# Altium footprint library Chestin_PcbLib.PcbLib: 203 footprints (part 10 of 13)
Each footprint in its own frame and in the unit in brackets; x right, y up, seen from the top. Pads: shape width x height; smd on the part's side, far side on the other; paste and mask are expansions set on the pad; w line width, h text height; cw(c..) or ccw(c..) is an arc to the next point about the centre after c.
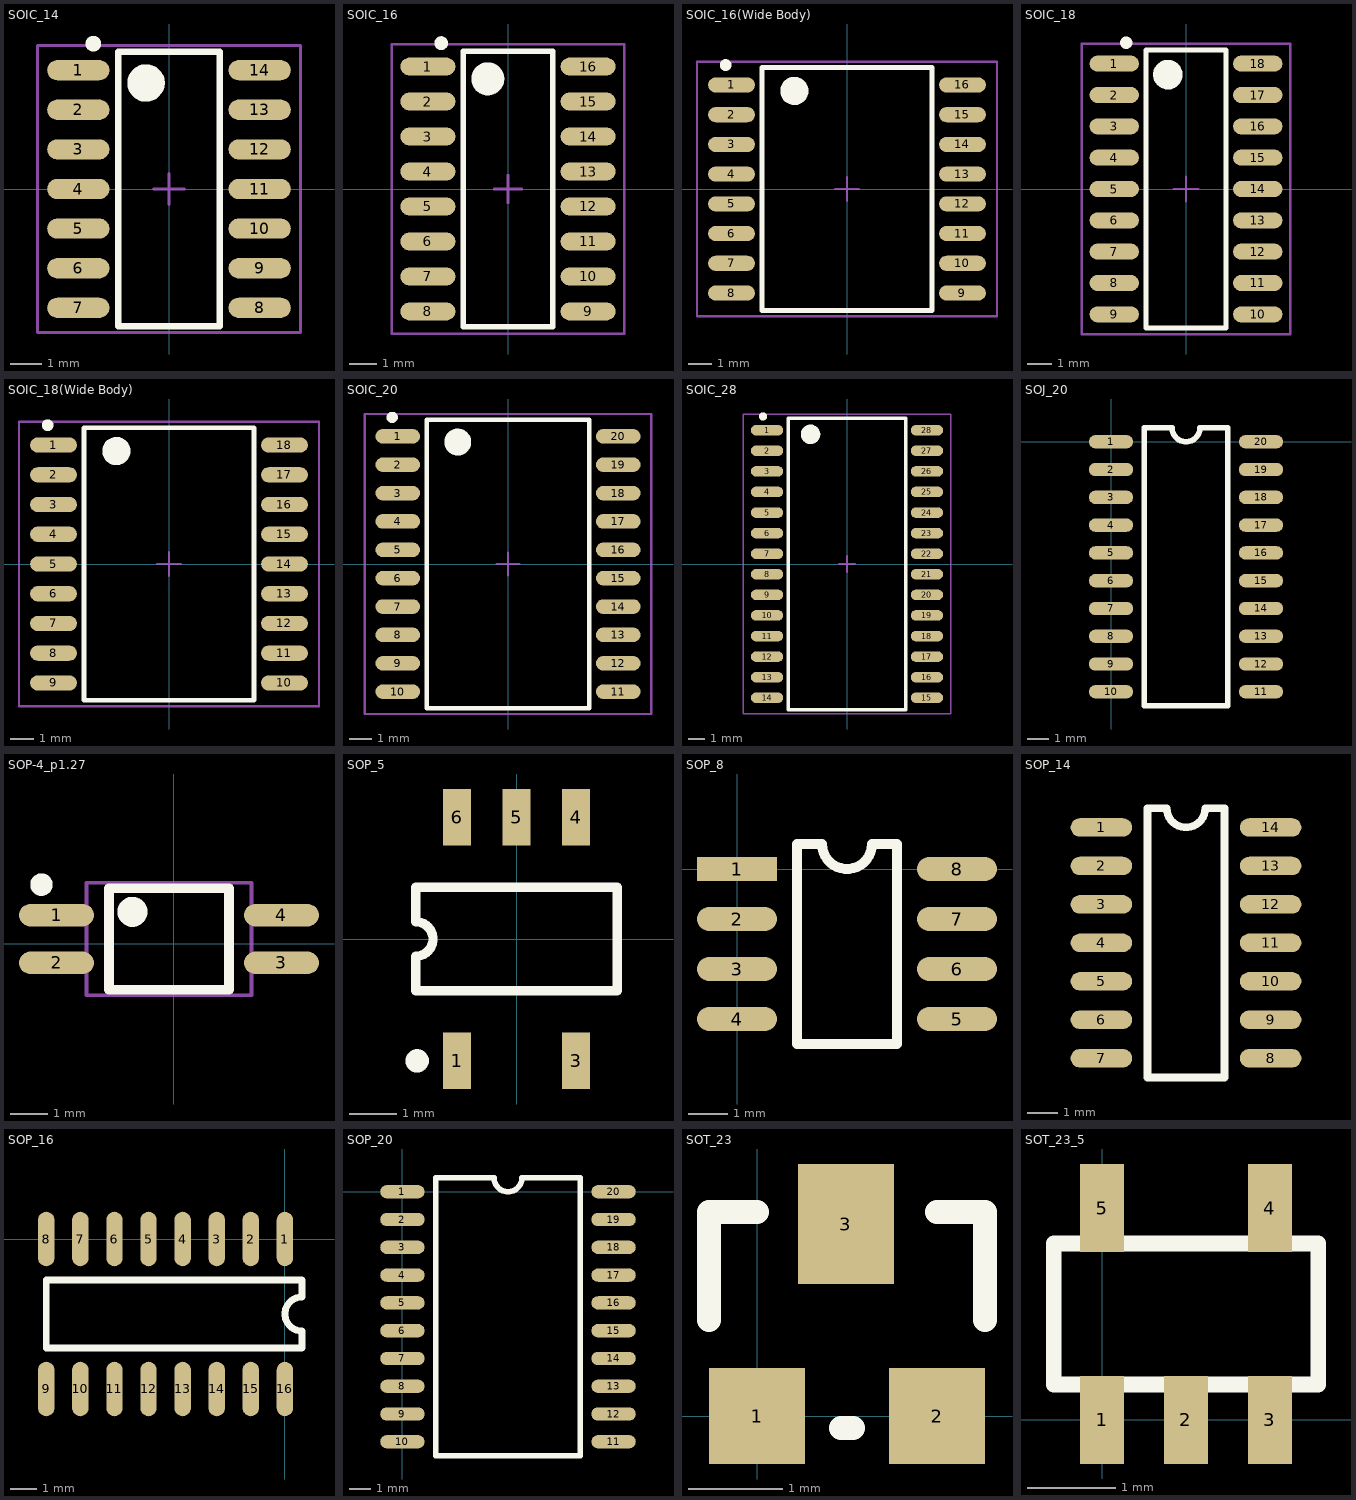
[diagram p9: the footprints below, top view; thin cyan lines are the x and y axes]

## SOIC_14 [mm]
height 1.75
pads (14):
  oval 2x0.65 smd: 1(-2.906,3.81) 2(-2.906,2.54) 3(-2.906,1.27) 4(-2.906,0) 5(-2.906,-1.27) 6(-2.906,-2.54) 7(-2.906,-3.81) 8(2.906,-3.81) 9(2.906,-2.54) 10(2.906,-1.27) 11(2.906,0) 12(2.906,1.27) 13(2.906,2.54) 14(2.906,3.81)
Top Overlay:
  circle w0.6: c-0.735,3.4 r0.3
  circle w0.25: c-2.425,4.66 r0.125
  lines w0.2: -1.626,-4.4 1.626,-4.4 1.626,4.4 -1.626,4.4 -1.626,-4.4
Mechanical 15:
  lines w0.1: -0.5,0 0.5,0 ; 0,-0.5 0,0.5 ; -4.216,-4.6 -4.216,4.6 4.216,4.6 4.216,-4.6 -4.216,-4.6
3D body "SOIC_14.STEP": height 1.66, standoff -0.02, extent -3.011,-4.3 3.01,4.3

## SOIC_16 [mm]
height 1.75
pads (16):
  oval 2x0.65 smd: 1(-2.906,4.445) 2(-2.906,3.175) 3(-2.906,1.905) 4(-2.906,0.635) 5(-2.906,-0.635) 6(-2.906,-1.905) 7(-2.906,-3.175) 8(-2.906,-4.445) 9(2.906,-4.445) 10(2.906,-3.175) 11(2.906,-1.905) 12(2.906,-0.635) 13(2.906,0.635) 14(2.906,1.905) 15(2.906,3.175) 16(2.906,4.445)
Top Overlay:
  circle w0.6: c-0.735,4 r0.3
  circle w0.25: c-2.425,5.295 r0.125
  lines w0.2: -1.626,-5 1.626,-5 1.626,5 -1.626,5 -1.626,-5
Mechanical 15:
  lines w0.1: -0.5,0 0.5,0 ; 0,-0.5 0,0.5 ; -4.216,-5.25 4.216,-5.25 4.216,5.25 -4.216,5.25 -4.216,-5.25
3D body "SOIC_16.STEP": height 1.48, standoff -0.01, extent -3.055,-5 3.056,5

## SOIC_16(Wide Body) [mm]
pads (16):
  oval 2x0.65 smd: 1(-4.933,4.445) 2(-4.933,3.175) 3(-4.933,1.905) 4(-4.933,0.635) 5(-4.933,-0.635) 6(-4.933,-1.905) 7(-4.933,-3.175) 8(-4.933,-4.445) 9(4.933,-4.445) 10(4.933,-3.175) 11(4.933,-1.905) 12(4.933,-0.635) 13(4.933,0.635) 14(4.933,1.905) 15(4.933,3.175) 16(4.933,4.445)
Top Overlay:
  circle w0.25: c-5.183,5.295 r0.125
  circle w0.6: c-2.25,4.19 r0.3
  lines w0.2: -3.632,-5.19 3.632,-5.19 3.632,5.19 -3.632,5.19 -3.632,-5.19
Mechanical 15:
  lines w0.1: -0.5,0 0.5,0 ; 0,-0.5 0,0.5 ; -6.408,-5.44 6.408,-5.44 6.408,5.44 -6.408,5.44 -6.408,-5.44
3D body "SOIC_16(Wide Body).STEP": height 2.5, standoff 0, extent -5.174,-5.15 5.175,5.15

## SOIC_18 [mm]
height 1.75
pads (18):
  oval 2x0.65 smd: 1(-2.906,5.08) 2(-2.906,3.81) 3(-2.906,2.54) 4(-2.906,1.27) 5(-2.906,0) 6(-2.906,-1.27) 7(-2.906,-2.54) 8(-2.906,-3.81) 9(-2.906,-5.08) 10(2.906,-5.08) 11(2.906,-3.81) 12(2.906,-2.54) 13(2.906,-1.27) 14(2.906,0) 15(2.906,1.27) 16(2.906,2.54) 17(2.906,3.81) 18(2.906,5.08)
Top Overlay:
  circle w0.6: c-0.735,4.635 r0.3
  circle w0.25: c-2.425,5.93 r0.125
  lines w0.2: -1.626,-5.635 -1.626,5.635 1.626,5.635 1.626,-5.635 -1.626,-5.635
Mechanical 15:
  lines w0.1: -0.5,0 0.5,0 ; 0,-0.5 0,0.5 ; -4.216,-5.885 -4.216,5.885 4.216,5.885 4.216,-5.885 -4.216,-5.885
3D body "SOIC_18.STEP": height 1.66, standoff -0.02, extent -3.011,-5.57 3.01,5.57

## SOIC_18(Wide Body) [mm]
pads (18):
  oval 2x0.65 smd: 1(-4.933,5.08) 2(-4.933,3.81) 3(-4.933,2.54) 4(-4.933,1.27) 5(-4.933,0) 6(-4.933,-1.27) 7(-4.933,-2.54) 8(-4.933,-3.81) 9(-4.933,-5.08) 10(4.933,-5.08) 11(4.933,-3.81) 12(4.933,-2.54) 13(4.933,-1.27) 14(4.933,0) 15(4.933,1.27) 16(4.933,2.54) 17(4.933,3.81) 18(4.933,5.08)
Top Overlay:
  circle w0.6: c-2.25,4.825 r0.3
  circle w0.25: c-5.183,5.93 r0.125
  lines w0.2: -3.632,-5.825 -3.632,5.825 3.632,5.825 3.632,-5.825 -3.632,-5.825
Mechanical 15:
  lines w0.1: -0.5,0 0.5,0 ; 0,-0.5 0,0.5 ; -6.408,-6.075 -6.408,6.075 6.408,6.075 6.408,-6.075 -6.408,-6.075
3D body "SOIC_18(Wide Body).STEP": height 2.5, standoff 0, extent -5.174,-5.785 5.175,5.785

## SOIC_20 [mm]
pads (20):
  oval 2x0.65 smd: 1(-4.933,5.715) 2(-4.933,4.445) 3(-4.933,3.175) 4(-4.933,1.905) 5(-4.933,0.635) 6(-4.933,-0.635) 7(-4.933,-1.905) 8(-4.933,-3.175) 9(-4.933,-4.445) 10(-4.933,-5.715) 11(4.933,-5.715) 12(4.933,-4.445) 13(4.933,-3.175) 14(4.933,-1.905) 15(4.933,-0.635) 16(4.933,0.635) 17(4.933,1.905) 18(4.933,3.175) 19(4.933,4.445) 20(4.933,5.715)
Top Overlay:
  circle w0.25: c-5.183,6.565 r0.125
  circle w0.6: c-2.25,5.46 r0.3
  lines w0.2: -3.632,-6.46 3.632,-6.46 3.632,6.46 -3.632,6.46 -3.632,-6.46
Mechanical 15:
  lines w0.1: -0.5,0 0.5,0 ; 0,-0.5 0,0.5 ; -6.408,-6.71 6.408,-6.71 6.408,6.71 -6.408,6.71 -6.408,-6.71
3D body "SOIC_20.STEP": height 2.54, standoff -0.01, extent -5.159,-6.4 5.16,6.4

## SOIC_28 [mm]
height 2.565
pads (28):
  oval 2x0.65 smd: 1(-4.933,8.255) 2(-4.933,6.985) 3(-4.933,5.715) 4(-4.933,4.445) 5(-4.933,3.175) 6(-4.933,1.905) 7(-4.933,0.635) 8(-4.933,-0.635) 9(-4.933,-1.905) 10(-4.933,-3.175) 11(-4.933,-4.445) 12(-4.933,-5.715) 13(-4.933,-6.985) 14(-4.933,-8.255) 15(4.933,-8.255) 16(4.933,-6.985) 17(4.933,-5.715) 18(4.933,-4.445) 19(4.933,-3.175) 20(4.933,-1.905) 21(4.933,-0.635) 22(4.933,0.635) 23(4.933,1.905) 24(4.933,3.175) 25(4.933,4.445) 26(4.933,5.715) 27(4.933,6.985) 28(4.933,8.255)
Top Overlay:
  circle w0.6: c-2.25,8 r0.3
  circle w0.25: c-5.183,9.105 r0.125
  lines w0.2: -3.632,-9 3.632,-9 3.632,9 -3.632,9 -3.632,-9
Mechanical 15:
  lines w0.1: -0.5,0 0.5,0 ; 0,-0.5 0,0.5 ; -6.408,-9.25 6.408,-9.25 6.408,9.25 -6.408,9.25 -6.408,-9.25
3D body "SOIC_28.STEP": height 2.55, standoff 0.02, extent -5.152,-8.975 5.152,8.975

## SOJ_20 [mil]
pads (20):
  oval 80x24 smd: 1(0,0) 2(0,-50) 3(0,-100) 4(0,-150) 5(0,-200) 6(0,-250) 7(0,-300) 8(0,-350) 9(0,-400) 10(0,-450) 11(270,-450) 12(270,-400) 13(270,-350) 14(270,-300) 15(270,-250) 16(270,-200) 17(270,-150) 18(270,-100) 19(270,-50) 20(270,0)
Top Overlay:
  lines w10: 60,-475 210,-475 210,25 160,25 cw(c135,25) 110,25 60,25 60,-475
3D body "Soj20.STEP": height 78.74, standoff 0, extent -6.64,-468.36 275.4,23.77

## SOP-4_p1.27 [mm]
pads (4):
  oval 2x0.6 smd: 1(-3.127,0.762) 2(-3.127,-0.508) 3(2.873,-0.508) 4(2.873,0.762)
Top Overlay:
  circle w0.3: c-3.527,1.577 r0.15
  circle w0.4: c-1.102,0.852 r0.2
  lines w0.254: -1.727,-1.223 -1.727,1.477 1.473,1.477 1.473,-1.223 -1.727,-1.223
Mechanical 13:
  lines w0.1: -2.327,-1.373 -2.327,1.627 2.073,1.627 2.073,-1.373 -2.327,-1.373

## SOP_5 [mm] "Small Outline; 6 Leads (1 Absent); Body Width 4.4 mm; Pitch 1.27 mm"
height 2.4
pads (5):
  rect 0.6x1.2 smd: 1(-1.27,-2.6) 3(1.27,-2.6) 4(1.27,2.6) 5(0,2.6) 6(-1.27,2.6)
Top Overlay:
  circle w0.25: c-2.12,-2.6 r0.125
  lines w0.2: -2.15,-1.1 -2.15,-0.367 ccw(c-2.15,0) -2.15,0.367 -2.15,1.1 2.15,1.1 2.15,-1.1 -2.15,-1.1

## SOP_8 [mil]
pads (8):
  rect 80x24 smd: 1(0,0)
  oval 80x24 smd: 2(0,-50) 3(0,-100) 4(0,-150) 5(220,-150) 6(220,-100) 7(220,-50) 8(220,0)
Top Overlay:
  lines w10: 60,-175 60,25 85,25 ccw(c110,25) 135,25 160,25 160,-175 60,-175
3D body "IRS21867S.STEP": height 68.9, standoff 0, extent -22.16,-173.42 232.17,23.43

## SOP_14 [mil]
pads (14):
  oval 80x24 smd: 1(142,-76) 2(142,-126) 3(142,-176) 4(142,-226) 5(142,-276) 6(142,-326) 7(142,-376) 8(362,-376) 9(362,-326) 10(362,-276) 11(362,-226) 12(362,-176) 13(362,-126) 14(362,-76)
Top Overlay:
  lines w10: 202,-401 202,-51 227,-51 ccw(c252,-51) 277,-51 302,-51 302,-401 202,-401
3D body "XO14.STEP": height 67.91, standoff -0.98, extent 129,-394.74 369.16,-50.26

## SOP_16 [mil]
pads (16):
  oval 24x80 smd: 1(0,0) 2(-50,0) 3(-100,0) 4(-150,0) 5(-200,0) 6(-250,0) 7(-300,0) 8(-350,0) 9(-350,-220) 10(-300,-220) 11(-250,-220) 12(-200,-220) 13(-150,-220) 14(-100,-220) 15(-50,-220) 16(0,-220)
Top Overlay:
  lines w10: -350,-160 25,-160 25,-135 cw(c25,-110) 25,-85 25,-60 -350,-60 -350,-160
3D body "sop-16 pos.STEP": height 78.31, standoff 0.31, extent -377.96,-220.13 22,14.13

## SOP_20 [mil]
pads (20):
  oval 80x24 smd: 1(0,0) 2(0,-50) 3(0,-100) 4(0,-150) 5(0,-200) 6(0,-250) 7(0,-300) 8(0,-350) 9(0,-400) 10(0,-450) 11(380,-450) 12(380,-400) 13(380,-350) 14(380,-300) 15(380,-250) 16(380,-200) 17(380,-150) 18(380,-100) 19(380,-50) 20(380,0)
Top Overlay:
  lines w10: 60,-475 320,-475 320,25 215,25 cw(c190,25) 165,25 60,25 60,-475

## SOT_23 [mil]
pads (3):
  rect 40x40 smd: 1(0,0) 2(75,0)
  rect 40x50 smd: 3(37,80)
Top Overlay:
  lines w10: -20,40 -20,85 0,85 ; 35,-5 40,-5 ; 75,85 95,85 95,40
3D body "SOT-23-3.STEP": height 47.24, standoff 0, extent -19.76,-11.65 94.42,98.59

## SOT_23_5 [mm]
pads (5):
  rect 0.5x1 smd: 1(0,0) 2(0.95,0) 3(1.9,0) 4(1.9,2.4) 5(0,2.4)
Top Overlay:
  lines w0.178: -0.55,0.4 2.45,0.4 2.45,2 -0.55,2 -0.55,0.4
3D body "User Library-SOT23-5.STEP": height 1.09, standoff -0.01, extent -0.5,-0.201 2.399,2.599